# Altium footprint library DSO.PcbLib: 80 footprints (part 3 of 5)
Each footprint in its own frame and in the unit in brackets; x right, y up, seen from the top. Pads: shape width x height; smd on the part's side, far side on the other; paste and mask are expansions set on the pad; w line width, h text height; cw(c..) or ccw(c..) is an arc to the next point about the centre after c.
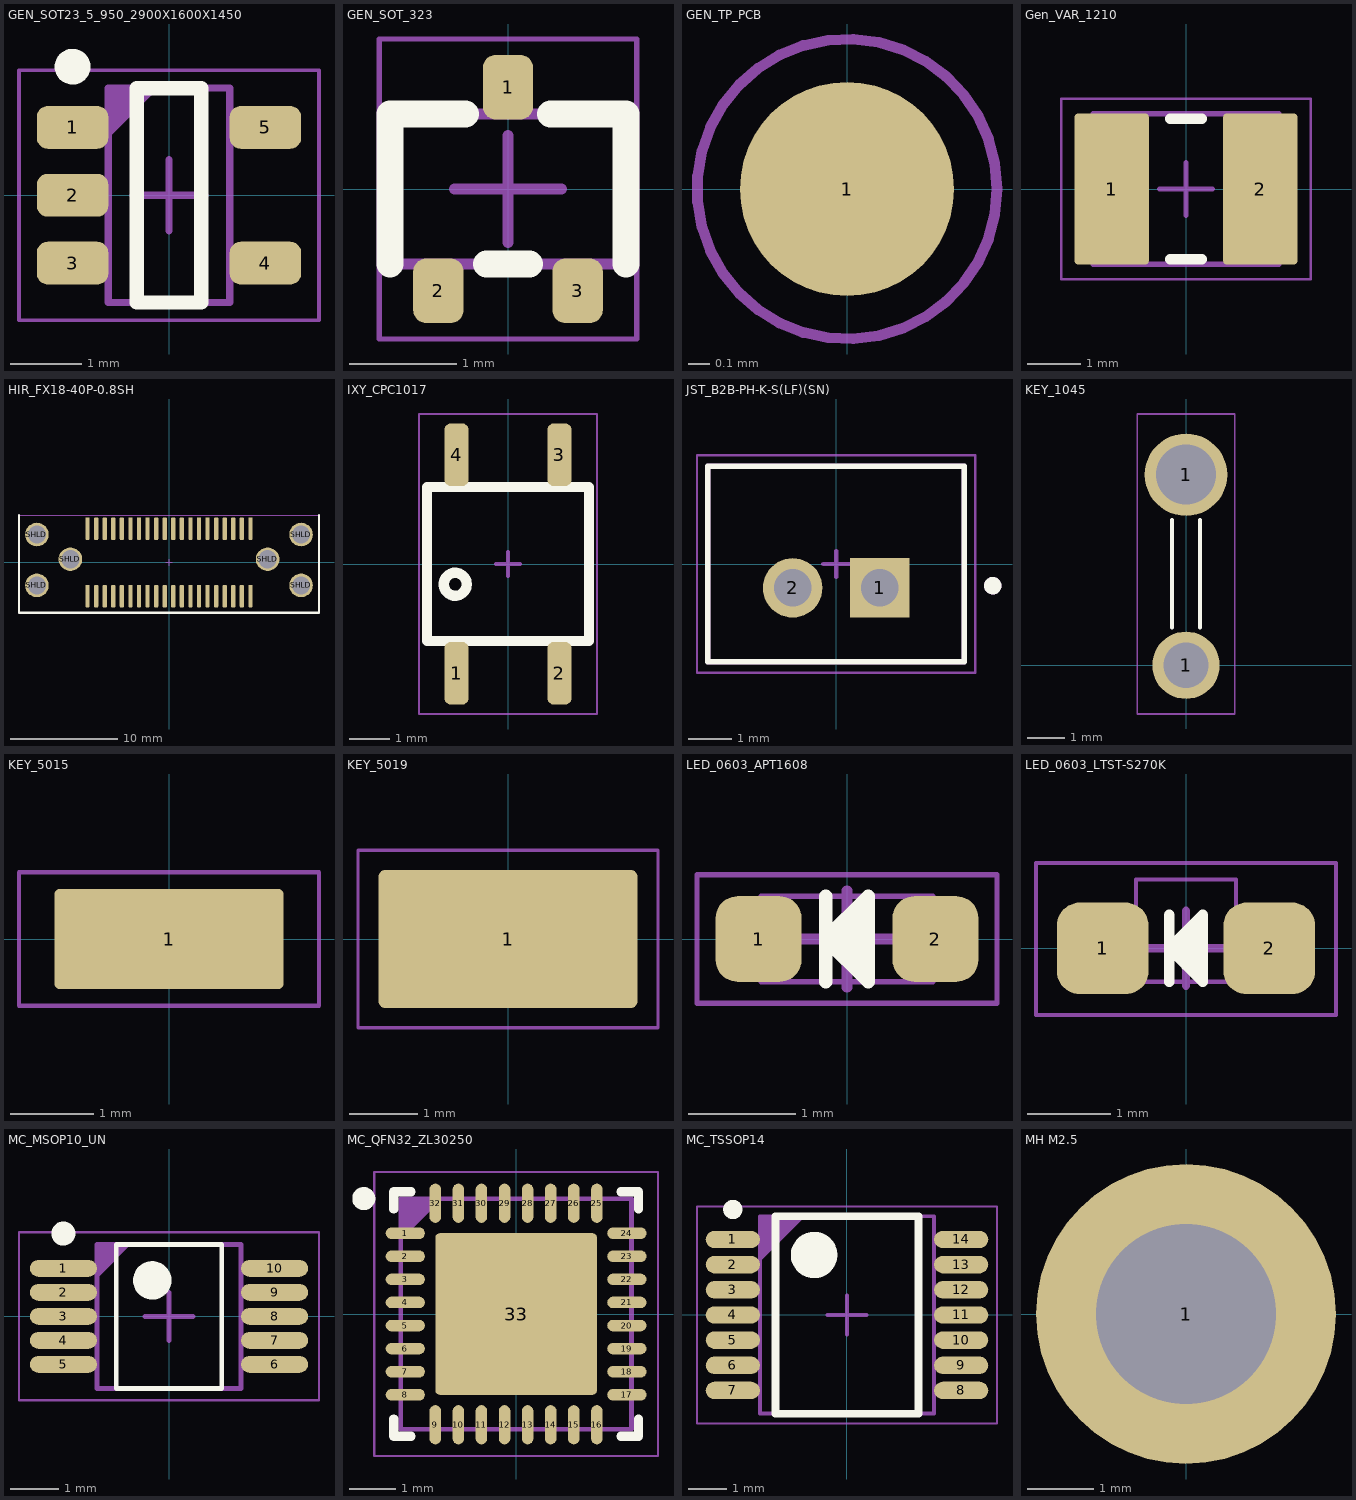
[diagram p2: the footprints below, top view; thin cyan lines are the x and y axes]

## GEN_SOT23_5_950_2900X1600X1450 [mm] "SOT23, 5-Leads, Body 2.90x2.80mm, Pitch 0.95mm, IPC Medium Density"
height 1.45
pads (5):
  rrect50% 1x0.6 smd: 1(-1.35,0.95) 2(-1.35,0) 3(-1.35,-0.95) 4(1.35,-0.95) 5(1.35,0.95)
Top Overlay:
  circle w0.25: c-1.35,1.8 r0.125
  lines w0.2: -0.45,-1.5 -0.45,1.5 0.45,1.5 0.45,-1.5 -0.45,-1.5
Top Courtyard:
  lines w0.05: -2.1,-1.75 2.1,-1.75 2.1,1.75 -2.1,1.75 -2.1,-1.75
Top Assembly:
  region: -0.85,0.8 -0.15,1.5 -0.85,1.5
  lines w0.1: -0.85,-1.5 0.85,-1.5 0.85,1.5 -0.85,1.5 -0.85,-1.5
  text ".Designator" at 0.209,-2.477 h1
Top Component Center:
  lines w0.1: -0.5,0 0.5,0 ; 0,-0.5 0,0.5
3D body "GEN_SOT23_5_950_2900X1600X1450.step": height 1.45, standoff 0, extent -1.5,-1.5 1.5,1.5

## GEN_SOT_323 [mm]
height 1.1
pads (3):
  rrect50% 0.47x0.6 smd: 1(0,0.95) 2(-0.65,-0.95) 3(0.65,-0.95)
Top Overlay:
  lines w0.254: -1.1,-0.7 -1.1,0.7 -0.4,0.7 ; -0.2,-0.7 0.2,-0.7 ; 0.4,0.7 1.1,0.7 1.1,-0.7
Top Courtyard:
  lines w0.05: -1.2,-1.4 1.2,-1.4 1.2,1.4 -1.2,1.4 -1.2,-1.4
Top Assembly:
  lines w0.1: -1.1,-0.7 1.1,-0.7 1.1,0.7 0.4,0.7 -1.1,0.7 -1.1,-0.7
  text ".Designator" at -2.477,-0.209 h1
Top Component Center:
  lines w0.1: -0.5,0 0.5,0 ; 0,-0.5 0,0.5
3D body: height 1.1, standoff 0, extent -1.227,-0.827 1.227,0.827

## GEN_TP_PCB [mm]
pads (1):
  round 1 smd paste-1: 1(0,0)
Top Courtyard:
  circle w0.05: c0,0 r0.7

## Gen_VAR_1210 [mm] "Chip Varistor, 2-Leads, Body 3.20x2.54mm, IPC Medium Density"
height 2.87
pads (2):
  rrect10% 1.4x2.85 smd: 1(-1.4,0) 2(1.4,0)
Top Overlay:
  lines w0.2: -0.3,-1.325 0.3,-1.325 ; -0.3,1.325 0.3,1.325
Top Courtyard:
  lines w0.05: -2.35,-1.7 2.35,-1.7 2.35,1.7 -2.35,1.7 -2.35,-1.7
Top Assembly:
  lines w0.1: -1.75,-1.42 -1.75,1.42 1.75,1.42 1.75,-1.42 -1.75,-1.42
  text ".Designator" at -2.477,-0.209 h1
Top Component Center:
  lines w0.1: -0.5,0 0.5,0 ; 0,-0.5 0,0.5
3D body "RESC3225X29N.step": height 2.87, standoff 0, extent -1.75,-1.42 1.75,1.42

## HIR_FX18-40P-0.8SH [mm]
height 9.65
pads (46):
  rrect50% 0.4x2.1 smd: 1(7.6,3.15) 2(6.8,3.15) 3(6,3.15) 4(5.2,3.15) 5(4.4,3.15) 6(3.6,3.15) 7(2.8,3.15) 8(2,3.15) 9(1.2,3.15) 10(0.4,3.15) 11(-0.4,3.15) 12(-1.2,3.15) 13(-2,3.15) 14(-2.8,3.15) 15(-3.6,3.15) 16(-4.4,3.15) 17(-5.2,3.15) 18(-6,3.15) 19(-6.8,3.15) 20(-7.6,3.15) 21(-7.6,-3.15) 22(-6.8,-3.15) 23(-6,-3.15) 24(-5.2,-3.15) 25(-4.4,-3.15) 26(-3.6,-3.15) 27(-2.8,-3.15) 28(-2,-3.15) 29(-1.2,-3.15) 30(-0.4,-3.15) 31(0.4,-3.15) 32(1.2,-3.15) 33(2,-3.15) 34(2.8,-3.15) 35(3.6,-3.15) 36(4.4,-3.15) 37(5.2,-3.15) 38(6,-3.15) 39(6.8,-3.15) 40(7.6,-3.15)
  round 2.2 hole 1.7: SHLD(-12.325,-2.15) SHLD(-12.325,2.6) SHLD(-9.2,0.3) SHLD(9.2,0.3) SHLD(12.325,-2.15) SHLD(12.325,2.6)
Top Overlay:
  lines w0.2: -14,4.4 -14,-4.7 14,-4.7 14,4.4
Top Courtyard:
  lines w0.05: -14,-4.7 14,-4.7 14,4.4 -14,4.4 -14,-4.7
Top Component Center:
  lines w0.1: -0.3,0 0.3,0 ; 0,-0.3 0,0.3
3D body "FX18-40P-0.8SH.stp": height 9.48, standoff -1.37, extent -13.95,-10.1 13.95,3.7

## IXY_CPC1017 [mm]
height 2
pads (4):
  rrect50% 0.6x1.54 smd: 1(-1.27,-2.695) 2(1.27,-2.695) 3(1.27,2.695) 4(-1.27,2.695)
Top Overlay:
  circle w0.254: c-1.3,-0.5 r0.283
  lines w0.254: -2,-1.9 -2,1.9 2,1.9 2,-1.9 -2,-1.9
Top Courtyard:
  lines w0.05: -2.2,-3.7 2.2,-3.7 2.2,3.7 -2.2,3.7 -2.2,-3.7
Top Component Center:
  lines w0.1: -0.3,0 0.3,0 ; 0,-0.3 0,0.3
3D body: height 2, standoff 0, extent -2.127,-2.027 2.127,2.027

## JST_B2B-PH-K-S(LF)(SN) [mm]
height 6
pads (2):
  rect 1.368x1.368 hole 0.86: 1(1,-0.55)
  round 1.368 hole 0.86: 2(-1,-0.55)
Top Overlay:
  circle w0.2: c3.6,-0.5 r0.1
  lines w0.127: -2.95,-2.25 -2.95,2.25 2.95,2.25 2.95,-2.25 -2.95,-2.25
Top Courtyard:
  lines w0.05: -3.2,-2.5 3.2,-2.5 3.2,2.5 -3.2,2.5 -3.2,-2.5
Top Assembly:
  circle w0.2: c3.6,-0.5 r0.1
  lines w0.127: -2.95,-2.25 -2.95,2.25 2.95,2.25 2.95,-2.25 -2.95,-2.25
Top Component Center:
  lines w0.1: -0.3,0 0.3,0 ; 0,-0.3 0,0.3
3D body: height 6, standoff 0, extent -2.949,-2.249 2.949,2.249

## KEY_1045 [mm]
height 4.5
pads (2):
  round 1.8 hole 1.2: 1(0,0)
  round 2.2 hole 1.6: 1(0,5.08)
Top Overlay:
  lines w0.1: -0.375,1 -0.375,3.875 ; 0.375,1 0.375,3.875
Top Courtyard:
  lines w0.05: -1.3,-1.3 -1.3,6.7 1.3,6.7 1.3,-1.3 -1.3,-1.3
3D body "keystone-PN1045.STEP": height 4.5, standoff -2.89, extent -0.318,-1.04 0.318,15.216

## KEY_5015 [mm] "PC TEST POINT MICRO MINIATURE"
height 1.52
pads (1):
  rrect10% 2.75x1.2 smd: 1(0,0)
Top Courtyard:
  lines w0.05: -1.8,-0.8 1.8,-0.8 1.8,0.8 -1.8,0.8 -1.8,-0.8
3D body "keystone-PN5015.STEP": height 1.52, standoff 0, extent -1.562,-0.508 1.562,0.508

## KEY_5019 [mm] "PC TEST POINT MINIATURE"
height 2.29
pads (1):
  rrect10% 3.8x2.03 smd: 1(0,0)
Top Courtyard:
  lines w0.05: -2.2,-1.3 -2.2,1.3 2.2,1.3 2.2,-1.3 -2.2,-1.3
3D body "keystone-PN5019.STEP": height 2.29, standoff 0, extent -1.905,-1 1.905,1.032

## LED_0603_APT1608 [mm]
height 0.75
pads (2):
  rrect50% 0.8x0.8 smd: 1(-0.825,0) 2(0.825,0)
Top Overlay:
  lines w0.127: -0.2,-0.4 -0.2,0.4 ; -0.1,-0.1 -0.1,0.1 ; 0,-0.2 0,0.2 ; 0.1,-0.25 0.1,0.225 ; -0.2,0 0.2,-0.4 0.2,0.4 -0.2,0
Top Courtyard:
  lines w0.05: -1.4,-0.6 -1.4,0.6 1.4,0.6 1.4,-0.6 -1.4,-0.6
Top Assembly:
  lines w0.05: -0.2,-0.4 -0.2,0.4 ; -0.8,-0.4 0.8,-0.4 0.8,0.4 -0.8,0.4 -0.8,-0.4 ; -0.2,0 0.2,0.4 0.2,-0.2 0.2,-0.4 -0.2,0
Top Component Center:
  lines w0.1: -0.45,0 0.45,0 ; 0,-0.45 0,0.45
3D body "APT1608.STEP": height 0.74, standoff -0.01, extent -0.806,-0.4 0.805,0.4

## LED_0603_LTST-S270K [mm]
height 0.6
pads (2):
  rrect50% 1.1x1.1 smd: 1(-1,0) 2(1,0)
Top Overlay:
  lines w0.127: -0.2,-0.4 -0.2,0.4 ; -0.1,-0.1 -0.1,0.1 ; 0,-0.2 0,0.2 ; 0.1,-0.25 0.1,0.225 ; -0.2,0 0.2,-0.4 0.2,0.4 -0.2,0
Top Courtyard:
  lines w0.05: -1.8,-0.8 1.8,-0.8 1.8,1.025 -1.8,1.025 -1.8,-0.8
Top Assembly:
  lines w0.05: -0.2,-0.4 -0.2,0.4 ; -0.825,-0.4 0.825,-0.4 0.825,0.35 0.6,0.35 0.6,0.825 0,0.825 -0.6,0.825 -0.6,0.35 -0.825,0.35 -0.825,-0.4 ; -0.2,0 0.2,-0.4 0.2,-0.2 0.2,0.4 -0.2,0
Top Component Center:
  lines w0.1: -0.45,0 0.45,0 ; 0,-0.45 0,0.45
3D body: height 0.6, standoff 0, extent -0.824,-0.329 0.824,0.824

## MC_MSOP10_UN [mm] "TSSOP, 10-Leads, Body 3.00x3.00mm, Pitch 0.50mm, IPC Medium Density"
height 1.1
pads (10):
  oval 1.4x0.35 smd: 1(-2.2,1) 2(-2.2,0.5) 3(-2.2,0) 4(-2.2,-0.5) 5(-2.2,-1) 6(2.2,-1) 7(2.2,-0.5) 8(2.2,0) 9(2.2,0.5) 10(2.2,1)
Top Overlay:
  circle w0.25: c-2.2,1.725 r0.125
  circle w0.4: c-0.35,0.75 r0.2
  lines w0.1: -1.1,-1.5 -1.1,1.5 1.1,1.5 1.1,-1.5 -1.1,-1.5
Top Courtyard:
  lines w0.05: -3.125,-1.75 -3.125,1.75 3.125,1.75 3.125,-1.75 -3.125,-1.75
Top Assembly:
  region: -1.5,0.8 -0.8,1.5 -1.5,1.5
  lines w0.1: -1.5,-1.5 -1.5,1.5 1.5,1.5 1.5,-1.5 -1.5,-1.5
  text ".Designator" at 0.209,-2.477 h1
Top Component Center:
  lines w0.1: -0.5,0 0.5,0 ; 0,-0.5 0,0.5
3D body "MC_MSOP10_UN.step": height 1.1, standoff 0, extent -2.45,-1.5 2.45,1.5

## MC_QFN32_ZL30250 [mm] "QFN, 32-Leads, Body 5.00x5.00mm, Pitch 0.50mm, Thermal Pad 3.50x3.50mm, IPC Medium Density"
height 1
pads (33):
  oval 0.85x0.25 smd: 1(-2.4,1.75) 2(-2.4,1.25) 3(-2.4,0.75) 4(-2.4,0.25) 5(-2.4,-0.25) 6(-2.4,-0.75) 7(-2.4,-1.25) 8(-2.4,-1.75) 17(2.4,-1.75) 18(2.4,-1.25) 19(2.4,-0.75) 20(2.4,-0.25) 21(2.4,0.25) 22(2.4,0.75) 23(2.4,1.25) 24(2.4,1.75)
  oval 0.25x0.85 smd: 9(-1.75,-2.4) 10(-1.25,-2.4) 11(-0.75,-2.4) 12(-0.25,-2.4) 13(0.25,-2.4) 14(0.75,-2.4) 15(1.25,-2.4) 16(1.75,-2.4) 25(1.75,2.4) 26(1.25,2.4) 27(0.75,2.4) 28(0.25,2.4) 29(-0.25,2.4) 30(-0.75,2.4) 31(-1.25,2.4) 32(-1.75,2.4)
  rrect5% 3.5x3.5 smd paste-3.5: 33(0,0)
Top Overlay:
  circle w0.25: c-3.3,2.5 r0.125
  lines w0.2: -2.65,-2.275 -2.65,-2.65 -2.275,-2.65 ; -2.65,2.275 -2.65,2.65 -2.275,2.65 ; 2.275,-2.65 2.65,-2.65 2.65,-2.275 ; 2.275,2.65 2.65,2.65 2.65,2.275
Top Paste:
  rectangle: 0.05,0.05 1.65,1.65
  rectangle: -1.65,0.05 -0.05,1.65
  rectangle: -1.65,-1.65 -0.05,-0.05
  rectangle: 0.05,-1.65 1.65,-0.05
Top Courtyard:
  lines w0.05: -3.075,-3.075 3.075,-3.075 3.075,3.075 -3.075,3.075 -3.075,-3.075
Top Assembly:
  region: -2.5,1.6 -1.6,2.5 -2.5,2.5
  lines w0.1: -2.5,-2.5 -2.5,2.5 2.5,2.5 2.5,-2.5 -2.5,-2.5
  text ".Designator" at -2.477,-0.209 h1
Top Component Center:
  lines w0.1: -0.5,0 0.5,0 ; 0,-0.5 0,0.5
3D body "MC_QFN32_ZL30250.step": height 1, standoff 0, extent -2.501,-2.501 2.501,2.501

## MC_TSSOP14 [mm] "TSOP, 14-Leads, Body 5.00x4.40mm, Pitch 0.65mm, IPC Medium Density"
height 1.2
pads (14):
  oval 1.4x0.45 smd: 1(-2.95,1.95) 2(-2.95,1.3) 3(-2.95,0.65) 4(-2.95,0) 5(-2.95,-0.65) 6(-2.95,-1.3) 7(-2.95,-1.95) 8(2.95,-1.95) 9(2.95,-1.3) 10(2.95,-0.65) 11(2.95,0) 12(2.95,0.65) 13(2.95,1.3) 14(2.95,1.95)
Top Overlay:
  circle w0.25: c-2.95,2.725 r0.125
  circle w0.6: c-0.85,1.55 r0.3
  lines w0.2: -1.85,-2.55 -1.85,2.55 1.85,2.55 1.85,-2.55 -1.85,-2.55
Top Courtyard:
  lines w0.05: -3.875,-2.8 -3.875,2.8 3.875,2.8 3.875,-2.8 -3.875,-2.8
Top Assembly:
  region: -2.25,1.375 -1.075,2.55 -2.25,2.55
  lines w0.1: -2.25,-2.55 -2.25,2.55 2.25,2.55 2.25,-2.55 -2.25,-2.55
  text ".Designator" at 0.209,-2.477 h1
Top Component Center:
  lines w0.1: -0.5,0 0.5,0 ; 0,-0.5 0,0.5
3D body "MC_TSSOP14.step": height 1.2, standoff 0, extent -3.2,-2.55 3.2,2.55

## MH M2.5 [mm]
pads (1):
  round 4.5 hole 2.7: 1(0,0)